# Altium footprint library IC_SMD_DUAL.PCBLIB: 169 footprints (part 2 of 11)
Each footprint in its own frame and in the unit in brackets; x right, y up, seen from the top. Pads: shape width x height; smd on the part's side, far side on the other; paste and mask are expansions set on the pad; w line width, h text height; cw(c..) or ccw(c..) is an arc to the next point about the centre after c.
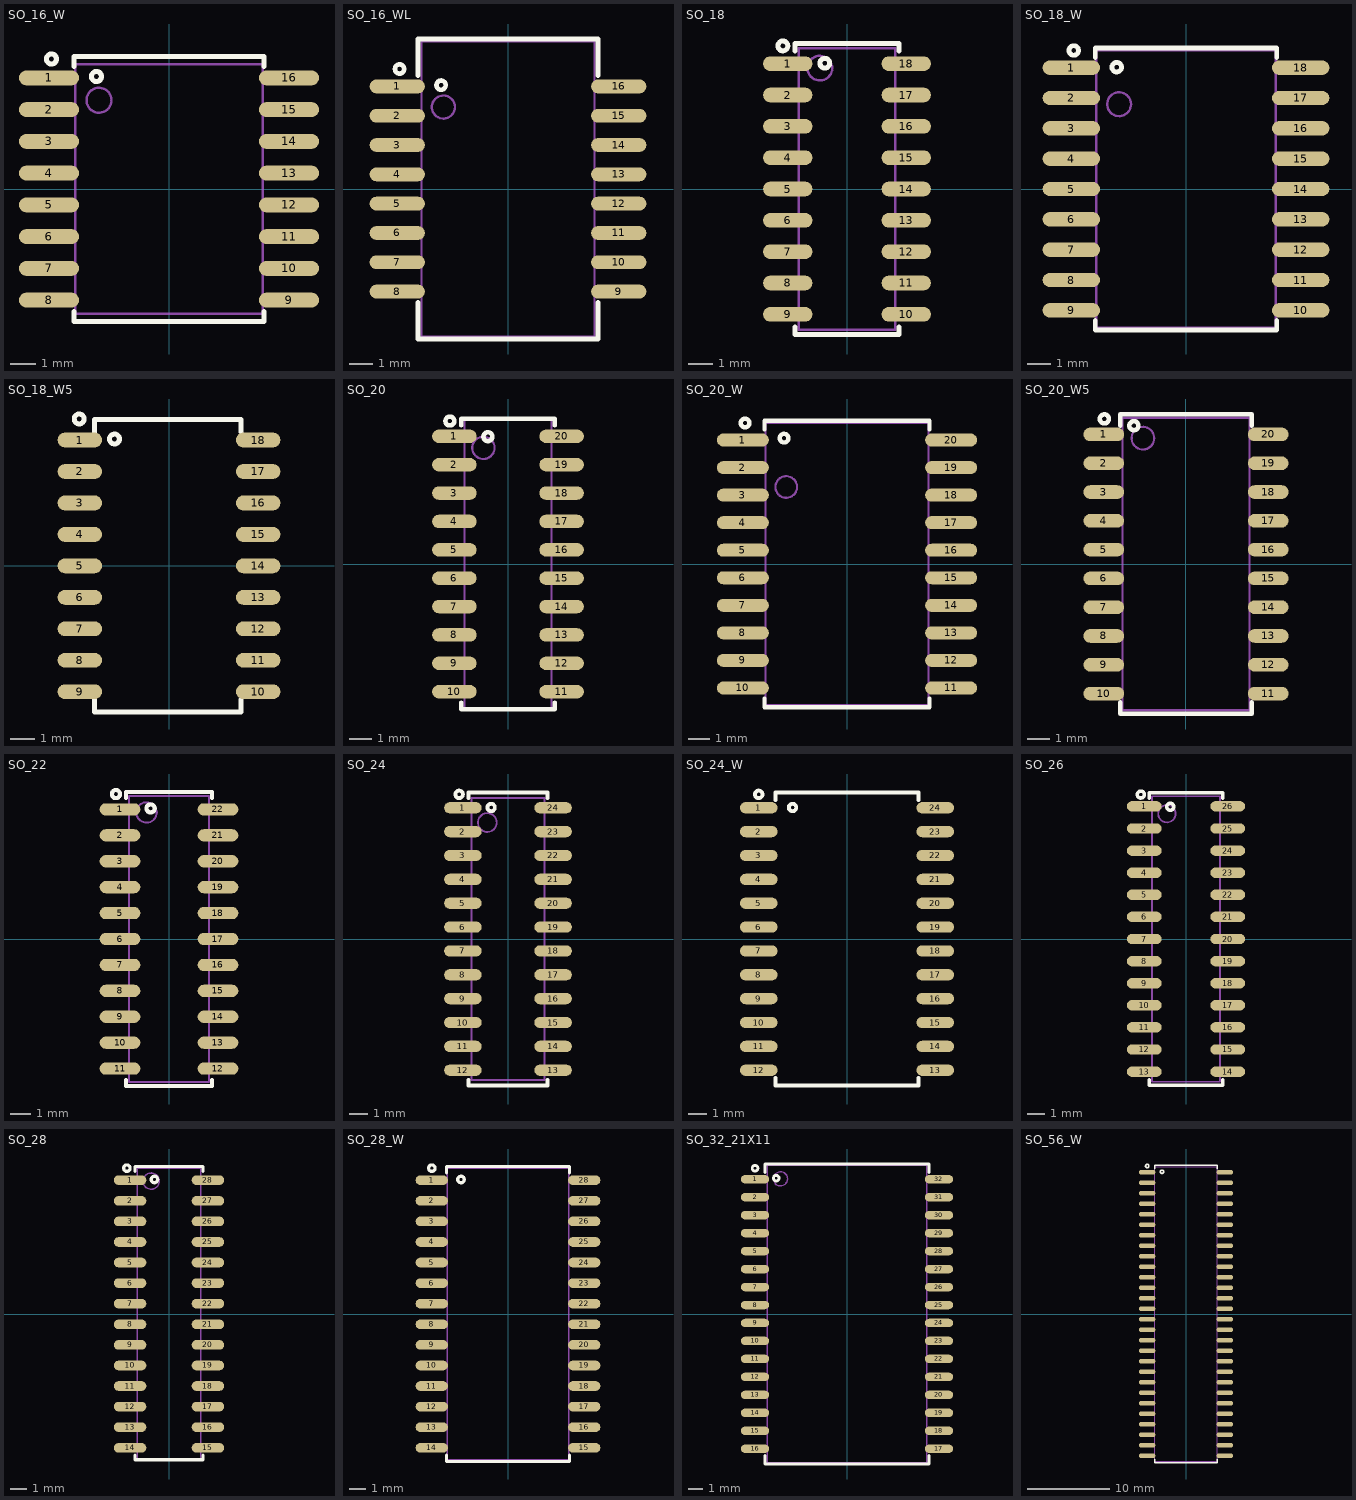
[diagram p1: the footprints below, top view; thin cyan lines are the x and y axes]

## SO_16_W [mm] "SOP, SOIC, 7.5mm width, 1.27mm pitch,"
pads (16):
  oval 2.4x0.6 smd: 1(-4.8,4.445) 2(-4.8,3.175) 3(-4.8,1.905) 4(-4.8,0.635) 5(-4.8,-0.635) 6(-4.8,-1.905) 7(-4.8,-3.175) 8(-4.8,-4.445) 9(4.8,-4.445) 10(4.8,-3.175) 11(4.8,-1.905) 12(4.8,-0.635) 13(4.8,0.635) 14(4.8,1.905) 15(4.8,3.175) 16(4.8,4.445)
TopOverlay:
  circle w0.2: c-2.9,4.5 r0.2
  circle w0.2: c-4.7,5.2 r0.2
  lines w0.2: -3.8,-4.9 -3.8,-5.3 3.8,-5.3 3.8,-4.9 ; -3.8,4.9 -3.8,5.3 3.8,5.3 3.8,4.9
Mechanical13:
  circle w0.1: c-2.8,3.55 r0.5
  lines w0.1: -3.75,-5 3.75,-5 3.75,5 -3.75,5 -3.75,-5
3D body "User Library-SOIC16_Wide_JEDEC_MS-013AA.step": height 2.62, standoff -0.03, extent -5.215,-5.25 5.415,5.25

## SO_16_WL [mm] "SOP, SOIC, 7.5mm width, 1.27mm pitch, MS-013-AC, RI-16-2, 16-Lead"
height 1.2
pads (16):
  oval 2.4x0.6 smd: 1(-4.8,4.445) 2(-4.8,3.175) 3(-4.8,1.905) 4(-4.8,0.635) 5(-4.8,-0.635) 6(-4.8,-1.905) 7(-4.8,-3.175) 8(-4.8,-4.445) 9(4.8,-4.445) 10(4.8,-3.175) 11(4.8,-1.905) 12(4.8,-0.635) 13(4.8,0.635) 14(4.8,1.905) 15(4.8,3.175) 16(4.8,4.445)
TopOverlay:
  circle w0.2: c-4.7,5.2 r0.2
  circle w0.2: c-2.9,4.5 r0.2
  lines w0.2: -3.9,-4.9 -3.9,-6.5 3.9,-6.5 3.9,-4.9 ; -3.9,4.9 -3.9,6.5 3.9,6.5 3.9,4.9
Mechanical13:
  circle w0.1: c-2.8,3.55 r0.5
  lines w0.1: -3.75,-6.4 -3.75,6.4 3.75,6.4 3.75,-6.4 -3.75,-6.4
3D body: height 2.6, standoff 0.08, extent -3.75,5.2 3.8,6.4
3D body: height 2.6, standoff 0.08, extent -3.75,-6.4 3.8,-5.2
3D body "User Library-SOIC16_Wide_JEDEC_MS-013AA.step": height 2.62, standoff -0.03, extent -5.215,-5.25 5.415,5.25

## SO_18 [mm] "SOP, SOIC, 3.9mm width, 1.27mm pitch,"
pads (18):
  oval 2x0.6 smd: 1(-2.4,5.08) 2(-2.4,3.81) 3(-2.4,2.54) 4(-2.4,1.27) 5(-2.4,0) 6(-2.4,-1.27) 7(-2.4,-2.54) 8(-2.4,-3.81) 9(-2.4,-5.08) 10(2.4,-5.08) 11(2.4,-3.81) 12(2.4,-2.54) 13(2.4,-1.27) 14(2.4,0) 15(2.4,1.27) 16(2.4,2.54) 17(2.4,3.81) 18(2.4,5.08)
TopOverlay:
  circle w0.2: c-2.6,5.8 r0.2
  circle w0.2: c-0.9,5.1 r0.2
  lines w0.2: -2.1,-5.6 -2.1,-5.9 2.1,-5.9 2.1,-5.6 ; -2.1,5.6 -2.1,5.9 2.1,5.9 2.1,5.6
Mechanical13:
  circle w0.1: c-1.1,4.9 r0.5
  lines w0.1: -1.95,-5.7 -1.95,5.7 1.95,5.7 1.95,-5.7 -1.95,-5.7
3D body "SOIC127P600-8N.step": height 2, standoff 0, extent -3.1,-5.75 3.1,5.75

## SO_18_W [mm] "SOP, SOIC, 7.5mm width, 1.27mm pitch,"
pads (18):
  oval 2.4x0.6 smd: 1(-4.8,5.08) 2(-4.8,3.81) 3(-4.8,2.54) 4(-4.8,1.27) 5(-4.8,0) 6(-4.8,-1.27) 7(-4.8,-2.54) 8(-4.8,-3.81) 9(-4.8,-5.08) 10(4.8,-5.08) 11(4.8,-3.81) 12(4.8,-2.54) 13(4.8,-1.27) 14(4.8,0) 15(4.8,1.27) 16(4.8,2.54) 17(4.8,3.81) 18(4.8,5.08)
TopOverlay:
  circle w0.2: c-2.9,5.1 r0.2
  circle w0.2: c-4.7,5.8 r0.2
  lines w0.2: -3.8,-5.5 -3.8,-5.9 3.8,-5.9 3.8,-5.5 ; -3.8,5.5 -3.8,5.9 3.8,5.9 3.8,5.5
Mechanical13:
  circle w0.1: c-2.8,3.55 r0.5
  lines w0.1: -3.75,-5.8 3.75,-5.8 3.75,5.8 -3.75,5.8 -3.75,-5.8
3D body "User Library-SOIC18-300.step": height 2.65, standoff 0, extent -5.15,-5.765 5.15,5.765

## SO_18_W5 [mm] "SOP-18, 5.4mm width, 1.27mm pitch,"
pads (18):
  oval 1.8x0.6 smd: 1(-3.6,5.08) 2(-3.6,3.81) 3(-3.6,2.54) 4(-3.6,1.27) 5(-3.6,0) 6(-3.6,-1.27) 7(-3.6,-2.54) 8(-3.6,-3.81) 9(-3.6,-5.08) 10(3.6,-5.08) 11(3.6,-3.81) 12(3.6,-2.54) 13(3.6,-1.27) 14(3.6,0) 15(3.6,1.27) 16(3.6,2.54) 17(3.6,3.81) 18(3.6,5.08)
TopOverlay:
  circle w0.2: c-3.625,5.93 r0.2
  circle w0.2: c-2.2,5.12 r0.2
  lines w0.2: -3,-5.4 -3,-5.9 2.9,-5.9 2.9,-5.4 ; -3,5.4 -3,5.9 2.9,5.9 2.9,5.4
3D body "SO_18_W55.step": height 2, standoff 0, extent -3.9,-5.8 3.9,5.8

## SO_20 [mm] "SOP, SOIC, 3.9mm width, 1.27mm pitch,"
pads (20):
  oval 2x0.6 smd: 1(-2.4,5.715) 2(-2.4,4.445) 3(-2.4,3.175) 4(-2.4,1.905) 5(-2.4,0.635) 6(-2.4,-0.635) 7(-2.4,-1.905) 8(-2.4,-3.175) 9(-2.4,-4.445) 10(-2.4,-5.715) 11(2.4,-5.715) 12(2.4,-4.445) 13(2.4,-3.175) 14(2.4,-1.905) 15(2.4,-0.635) 16(2.4,0.635) 17(2.4,1.905) 18(2.4,3.175) 19(2.4,4.445) 20(2.4,5.715)
TopOverlay:
  circle w0.2: c-0.9,5.7 r0.2
  circle w0.2: c-2.6,6.4 r0.2
  lines w0.2: -2.1,-6.2 -2.1,-6.5 2.1,-6.5 2.1,-6.2 ; -2.1,6.2 -2.1,6.5 2.1,6.5 2.1,6.2
Mechanical13:
  circle w0.1: c-1.1,5.2 r0.5
  lines w0.1: -1.95,-6.5 1.95,-6.5 1.95,6.5 -1.95,6.5 -1.95,-6.5
3D body "SOIC127P600-8N.step": height 2, standoff 0, extent -3.1,-6.5 3.1,6.5

## SO_20_W [mm] "SOP, SOIC, 7.5mm width, 1.27mm pitch,"
pads (20):
  oval 2.4x0.6 smd: 1(-4.8,5.715) 2(-4.8,4.445) 3(-4.8,3.175) 4(-4.8,1.905) 5(-4.8,0.635) 6(-4.8,-0.635) 7(-4.8,-1.905) 8(-4.8,-3.175) 9(-4.8,-4.445) 10(-4.8,-5.715) 11(4.8,-5.715) 12(4.8,-4.445) 13(4.8,-3.175) 14(4.8,-1.905) 15(4.8,-0.635) 16(4.8,0.635) 17(4.8,1.905) 18(4.8,3.175) 19(4.8,4.445) 20(4.8,5.715)
TopOverlay:
  circle w0.2: c-2.9,5.8 r0.2
  circle w0.2: c-4.7,6.5 r0.2
  lines w0.2: -3.8,-6.2 -3.8,-6.6 3.8,-6.6 3.8,-6.2 ; -3.8,6.2 -3.8,6.6 3.8,6.6 3.8,6.2
Mechanical13:
  circle w0.1: c-2.8,3.55 r0.5
  lines w0.1: -3.75,-6.5 3.75,-6.5 3.75,6.5 -3.75,6.5 -3.75,-6.5
3D body "User Library-SOIC20_W.STEP": height 2.65, standoff 0, extent -5.325,-6.5 5.325,6.5

## SO_20_W5 [mm] "SOP, 20-Leads, Body 12.60x5.30mm, Pitch 1.27mm, NS"
height 2
pads (20):
  oval 1.8x0.6 smd: 1(-3.625,5.715) 2(-3.625,4.445) 3(-3.625,3.175) 4(-3.625,1.905) 5(-3.625,0.635) 6(-3.625,-0.635) 7(-3.625,-1.905) 8(-3.625,-3.175) 9(-3.625,-4.445) 10(-3.625,-5.715) 11(3.625,-5.715) 12(3.625,-4.445) 13(3.625,-3.175) 14(3.625,-1.905) 15(3.625,-0.635) 16(3.625,0.635) 17(3.625,1.905) 18(3.625,3.175) 19(3.625,4.445) 20(3.625,5.715)
TopOverlay:
  circle w0.2: c-3.6,6.4 r0.2
  circle w0.2: c-2.3,6.1 r0.2
  lines w0.2: -2.9,-6.1 -2.9,-6.6 2.9,-6.6 2.9,-6.1 ; -2.9,6.1 -2.9,6.6 2.9,6.6 2.9,6.1
Mechanical13:
  circle w0.1: c-1.9,5.55 r0.5
  lines w0.1: -2.8,-6.45 -2.8,6.45 2.8,6.45 2.8,-6.45 -2.8,-6.45
3D body "SO_20_W5.step": height 2, standoff 0, extent -3.9,-6.45 3.9,6.45

## SO_22 [mm] "SOP, SOIC, 3.9mm width, 1.27mm pitch,"
pads (22):
  oval 2x0.6 smd: 1(-2.4,6.35) 2(-2.4,5.08) 3(-2.4,3.81) 4(-2.4,2.54) 5(-2.4,1.27) 6(-2.4,0) 7(-2.4,-1.27) 8(-2.4,-2.54) 9(-2.4,-3.81) 10(-2.4,-5.08) 11(-2.4,-6.35) 12(2.4,-6.35) 13(2.4,-5.08) 14(2.4,-3.81) 15(2.4,-2.54) 16(2.4,-1.27) 17(2.4,0) 18(2.4,1.27) 19(2.4,2.54) 20(2.4,3.81) 21(2.4,5.08) 22(2.4,6.35)
TopOverlay:
  circle w0.2: c-2.6,7.1 r0.2
  circle w0.2: c-0.9,6.4 r0.2
  lines w0.2: -2.1,-6.9 -2.1,-7.2 2.1,-7.2 2.1,-6.9 ; -2.1,6.9 -2.1,7.2 2.1,7.2 2.1,6.9
Mechanical13:
  circle w0.1: c-1.1,6.2 r0.5
  lines w0.1: -1.95,-7 -1.95,7 1.95,7 1.95,-7 -1.95,-7
3D body "SOIC127P600-8N.step": height 2, standoff 0, extent -3.1,-7 3.1,7

## SO_24 [mm] "SOP, SOIC, 3.9mm width, 1.27mm pitch,"
pads (24):
  oval 2x0.6 smd: 1(-2.4,6.985) 2(-2.4,5.715) 3(-2.4,4.445) 4(-2.4,3.175) 5(-2.4,1.905) 6(-2.4,0.635) 7(-2.4,-0.635) 8(-2.4,-1.905) 9(-2.4,-3.175) 10(-2.4,-4.445) 11(-2.4,-5.715) 12(-2.4,-6.985) 13(2.4,-6.985) 14(2.4,-5.715) 15(2.4,-4.445) 16(2.4,-3.175) 17(2.4,-1.905) 18(2.4,-0.635) 19(2.4,0.635) 20(2.4,1.905) 21(2.4,3.175) 22(2.4,4.445) 23(2.4,5.715) 24(2.4,6.985)
TopOverlay:
  circle w0.2: c-2.6,7.7 r0.2
  circle w0.2: c-0.9,7 r0.2
  lines w0.2: -2.1,-7.5 -2.1,-7.8 2.1,-7.8 2.1,-7.5 ; -2.1,7.5 -2.1,7.8 2.1,7.8 2.1,7.5
Mechanical13:
  circle w0.1: c-1.1,6.2 r0.5
  lines w0.1: -1.95,-7.5 -1.95,7.5 1.95,7.5 1.95,-7.5 -1.95,-7.5
3D body "SOIC127P600-8N.step": height 2, standoff 0, extent -3.1,-7.5 3.1,7.5

## SO_24_W [mm] "SOP, SOIC, 7.5mm width, 1.27mm pitch,"
pads (24):
  oval 2x0.6 smd: 1(-4.7,6.985) 2(-4.7,5.715) 3(-4.7,4.445) 4(-4.7,3.175) 5(-4.7,1.905) 6(-4.7,0.635) 7(-4.7,-0.635) 8(-4.7,-1.905) 9(-4.7,-3.175) 10(-4.7,-4.445) 11(-4.7,-5.715) 12(-4.7,-6.985) 13(4.7,-6.985) 14(4.7,-5.715) 15(4.7,-4.445) 16(4.7,-3.175) 17(4.7,-1.905) 18(4.7,-0.635) 19(4.7,0.635) 20(4.7,1.905) 21(4.7,3.175) 22(4.7,4.445) 23(4.7,5.715) 24(4.7,6.985)
TopOverlay:
  circle w0.2: c-4.7,7.7 r0.2
  circle w0.2: c-2.9,7 r0.2
  lines w0.2: -3.8,-7.4 -3.8,-7.8 3.8,-7.8 3.8,-7.4 ; -3.8,7.4 -3.8,7.8 3.8,7.8 3.8,7.4
3D body "SO_24WW.step": height 2.65, standoff 0, extent -5.15,-7.5 5.15,7.5

## SO_26 [mm] "SOP, SOIC, 3.9mm width, 1.27mm pitch,"
pads (26):
  oval 2x0.6 smd: 1(-2.4,7.62) 2(-2.4,6.35) 3(-2.4,5.08) 4(-2.4,3.81) 5(-2.4,2.54) 6(-2.4,1.27) 7(-2.4,0) 8(-2.4,-1.27) 9(-2.4,-2.54) 10(-2.4,-3.81) 11(-2.4,-5.08) 12(-2.4,-6.35) 13(-2.4,-7.62) 14(2.4,-7.62) 15(2.4,-6.35) 16(2.4,-5.08) 17(2.4,-3.81) 18(2.4,-2.54) 19(2.4,-1.27) 20(2.4,0) 21(2.4,1.27) 22(2.4,2.54) 23(2.4,3.81) 24(2.4,5.08) 25(2.4,6.35) 26(2.4,7.62)
TopOverlay:
  circle w0.2: c-2.6,8.3 r0.2
  circle w0.2: c-0.9,7.6 r0.2
  lines w0.2: -2.1,-8.1 -2.1,-8.4 2.1,-8.4 2.1,-8.1 ; -2.1,8.1 -2.1,8.4 2.1,8.4 2.1,8.1
Mechanical13:
  circle w0.1: c-1.1,7.2 r0.5
  lines w0.1: -1.95,-8.2 -1.95,8.2 1.95,8.2 1.95,-8.2 -1.95,-8.2
3D body "SO_26-.step": height 2, standoff 0, extent -3.1,-8.25 3.1,8.25

## SO_28 [mm] "SOP, SOIC, 3.9mm width, 1.27mm pitch,"
pads (28):
  oval 2x0.6 smd: 1(-2.4,8.255) 2(-2.4,6.985) 3(-2.4,5.715) 4(-2.4,4.445) 5(-2.4,3.175) 6(-2.4,1.905) 7(-2.4,0.635) 8(-2.4,-0.635) 9(-2.4,-1.905) 10(-2.4,-3.175) 11(-2.4,-4.445) 12(-2.4,-5.715) 13(-2.4,-6.985) 14(-2.4,-8.255) 15(2.4,-8.255) 16(2.4,-6.985) 17(2.4,-5.715) 18(2.4,-4.445) 19(2.4,-3.175) 20(2.4,-1.905) 21(2.4,-0.635) 22(2.4,0.635) 23(2.4,1.905) 24(2.4,3.175) 25(2.4,4.445) 26(2.4,5.715) 27(2.4,6.985) 28(2.4,8.255)
TopOverlay:
  circle w0.2: c-2.6,9 r0.2
  circle w0.2: c-0.9,8.3 r0.2
  lines w0.2: -2.1,-8.7 -2.1,-9 2.1,-9 2.1,-8.7 ; -2.1,8.8 -2.1,9.1 2.1,9.1 2.1,8.8
Mechanical13:
  circle w0.1: c-1.1,8.2 r0.5
  lines w0.1: -1.95,-9 -1.95,9 1.95,9 1.95,-9 -1.95,-9
3D body "SO_288.step": height 2, standoff 0, extent -3.1,-9 3.1,9

## SO_28_W [mm] "SOP, SOIC, 7.5mm width, 1.27mm pitch,"
pads (28):
  oval 2x0.6 smd: 1(-4.7,8.255) 2(-4.7,6.985) 3(-4.7,5.715) 4(-4.7,4.445) 5(-4.7,3.175) 6(-4.7,1.905) 7(-4.7,0.635) 8(-4.7,-0.635) 9(-4.7,-1.905) 10(-4.7,-3.175) 11(-4.7,-4.445) 12(-4.7,-5.715) 13(-4.7,-6.985) 14(-4.7,-8.255) 15(4.7,-8.255) 16(4.7,-6.985) 17(4.7,-5.715) 18(4.7,-4.445) 19(4.7,-3.175) 20(4.7,-1.905) 21(4.7,-0.635) 22(4.7,0.635) 23(4.7,1.905) 24(4.7,3.175) 25(4.7,4.445) 26(4.7,5.715) 27(4.7,6.985) 28(4.7,8.255)
TopOverlay:
  circle w0.2: c-4.7,9 r0.2
  circle w0.2: c-2.9,8.3 r0.2
  lines w0.2: -3.8,-8.7 -3.8,-9.1 3.8,-9.1 3.8,-8.7 ; -3.8,8.7 -3.8,9.1 3.8,9.1 3.8,8.7
Mechanical13:
  lines w0.1: -3.75,-9 -3.75,9 3.75,9 3.75,-9 -3.75,-9
3D body "SO_28_WW.step": height 2.65, standoff 0, extent -5.15,-9 5.15,9

## SO_32_21X11 [mm]
height 2
pads (32):
  oval 2x0.6 smd: 1(-6.5,9.525) 2(-6.5,8.255) 3(-6.5,6.985) 4(-6.5,5.715) 5(-6.5,4.445) 6(-6.5,3.175) 7(-6.5,1.905) 8(-6.5,0.635) 9(-6.5,-0.635) 10(-6.5,-1.905) 11(-6.5,-3.175) 12(-6.5,-4.445) 13(-6.5,-5.715) 14(-6.5,-6.985) 15(-6.5,-8.255) 16(-6.5,-9.525) 17(6.5,-9.525) 18(6.5,-8.255) 19(6.5,-6.985) 20(6.5,-5.715) 21(6.5,-4.445) 22(6.5,-3.175) 23(6.5,-1.905) 24(6.5,-0.635) 25(6.5,0.635) 26(6.5,1.905) 27(6.5,3.175) 28(6.5,4.445) 29(6.5,5.715) 30(6.5,6.985) 31(6.5,8.255) 32(6.5,9.525)
TopOverlay:
  circle w0.2: c-5,9.6 r0.2
  circle w0.2: c-6.5,10.3 r0.2
  lines w0.2: -5.8,-10 -5.8,-10.6 5.8,-10.6 5.8,-10 ; -5.8,10 -5.8,10.6 5.8,10.6 5.8,10
Mechanical13:
  circle w0.1: c-4.7,9.55 r0.5
  lines w0.1: -5.65,-10.5 -5.65,10.5 5.65,10.5 5.65,-10.5 -5.65,-10.5
3D body "SO_32.step": height 2.6, standoff 0, extent -7.125,-10.5 7.125,10.5

## SO_56_W [mm] "SOP, SOIC, 7.5mm width, 1.27mm pitch,"
pads (56):
  oval 2x0.6 smd: 1(-4.7,17.145) 2(-4.7,15.875) 3(-4.7,14.605) 4(-4.7,13.335) 5(-4.7,12.065) 6(-4.7,10.795) 7(-4.7,9.525) 8(-4.7,8.255) 9(-4.7,6.985) 10(-4.7,5.715) 11(-4.7,4.445) 12(-4.7,3.175) 13(-4.7,1.905) 14(-4.7,0.635) 15(-4.7,-0.635) 16(-4.7,-1.905) 17(-4.7,-3.175) 18(-4.7,-4.445) 19(-4.7,-5.715) 20(-4.7,-6.985) 21(-4.7,-8.255) 22(-4.7,-9.525) 23(-4.7,-10.795) 24(-4.7,-12.065) 25(-4.7,-13.335) 26(-4.7,-14.605) 27(-4.7,-15.875) 28(-4.7,-17.145) 29(4.7,-17.145) 30(4.7,-15.875) 31(4.7,-14.605) 32(4.7,-13.335) 33(4.7,-12.065) 34(4.7,-10.795) 35(4.7,-9.525) 36(4.7,-8.255) 37(4.7,-6.985) 38(4.7,-5.715) 39(4.7,-4.445) 40(4.7,-3.175) 41(4.7,-1.905) 42(4.7,-0.635) 43(4.7,0.635) 44(4.7,1.905) 45(4.7,3.175) 46(4.7,4.445) 47(4.7,5.715) 48(4.7,6.985) 49(4.7,8.255) 50(4.7,9.525) 51(4.7,10.795) 52(4.7,12.065) 53(4.7,13.335) 54(4.7,14.605) 55(4.7,15.875) 56(4.7,17.145)
TopOverlay:
  circle w0.2: c-4.7,17.9 r0.2
  circle w0.2: c-2.9,17.2 r0.2
  lines w0.2: -3.8,-17.6 -3.8,-18 3.8,-18 3.8,-17.6 ; -3.8,17.6 -3.8,18 3.8,18 3.8,17.6
Mechanical13:
  lines w0.1: -3.75,-17.8 -3.75,17.8 3.75,17.8 3.75,-17.8 -3.75,-17.8
3D body "SO_56_WW.step": height 2.65, standoff 0, extent -5.15,-17.5 5.15,17.5